# Altium footprint library 总库.PcbLib: 264 footprints (part 11 of 17)
Each footprint in its own frame and in the unit in brackets; x right, y up, seen from the top. Pads: shape width x height; smd on the part's side, far side on the other; paste and mask are expansions set on the pad; w line width, h text height; cw(c..) or ccw(c..) is an arc to the next point about the centre after c.
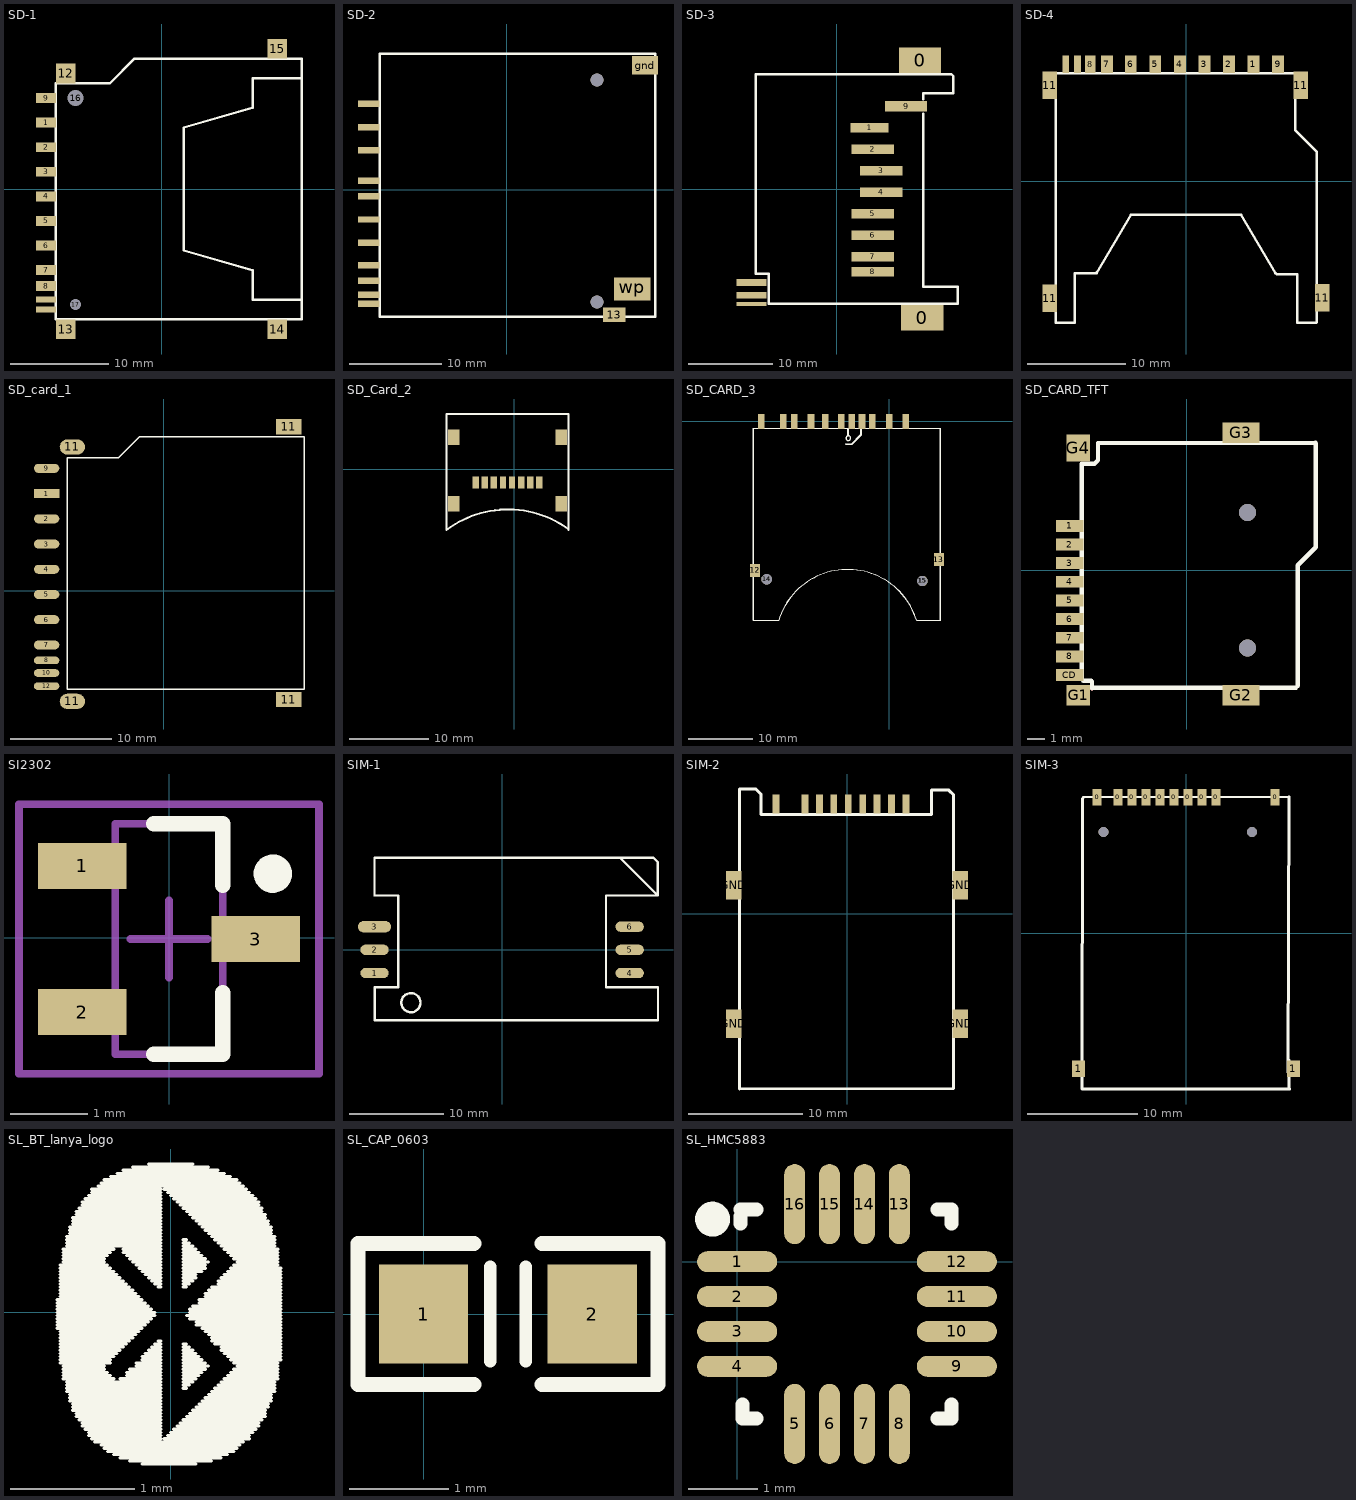
[diagram p10: the footprints below, top view; thin cyan lines are the x and y axes]

## SD-1 [mm]
pads (17):
  rect 2x1 smd: 1(-11.75,6.75) 2(-11.75,4.25) 3(-11.75,1.75) 4(-11.75,-0.75) 5(-11.75,-3.25) 6(-11.75,-5.75) 7(-11.75,-8.25) 8(-11.75,-9.875) 9(-11.75,9.25)
  rect 2x0.6 smd: 10(-11.75,-12.25) 11(-11.75,-11.25)
  rect 2x2 smd: 12(-9.75,11.75) 13(-9.75,-14.25) 14(11.75,-14.25) 15(11.75,14.25)
  round 1.5 hole 1.6: 16(-8.75,9.25)
  round 1 hole 1.1: 17(-8.75,-11.75)
Top Overlay:
  lines w0.254: 14.25,-11.25 9.25,-11.25 9.25,-8.25 2.25,-6.25 2.25,6.25 9.25,8.25 9.25,11.25 14.25,11.25 ; -10.75,-13.25 -10.75,10.75 -5.25,10.75 -2.75,13.25 14.25,13.25 14.25,-13.25 -10.75,-13.25

## SD-2 [mm]
pads (14):
  rect 2.35x0.7 smd: 1(-14.935,6.8) 2(-14.935,4.3) 3(-14.935,1) 4(-14.935,-0.7) 5(-14.935,-3.2) 6(-14.935,-5.7) 7(-14.935,-8.13) 8(-14.935,-9.82) 9(-14.935,9.3) cd(-14.935,-11.32) com(-14.935,-12.32)
  rect 2.4x1.6 smd: 13(11.595,-13.5)
  rect 2.8x2 smd: gnd(14.935,13.5)
  rect 3.95x2.5 smd: wp(13.565,-10.7)
via 9.735,11.9 diameter 1.4 hole 1.4
via 9.735,-12.1 diameter 1.4 hole 1.4
Top Overlay:
  lines w0.254: -13.76,-13.72 16.045,-13.72 16.045,14.72 -13.76,14.72 -13.76,-13.72

## SD-3 [mm]
pads (14):
  rect 5x3 smd: 0(9.843,15.24) 0(10.097,-15.24)
  rect 4.5x1.143 smd: 1(3.874,7.239)
  rect 5x1.143 smd: 2(4.255,4.699) 3(5.271,2.159) 4(5.271,-0.381) 5(4.255,-2.921) 6(4.255,-5.461) 7(4.255,-8.001) 8(4.255,-9.779)
  rect 5x1.27 smd: 9(8.192,9.779)
  rect 3.556x0.8 smd: 10(-10.097,-11.049) 11(-10.097,-12.573)
  rect 3.556x0.5 smd: 12(-10.097,-13.589)
Top Overlay:
  lines w0.3: 7.683,-13.589 14.287,-13.589 14.287,-11.557 10.223,-11.557 10.223,8.889 ; 8.191,-13.589 -8.065,-13.589 -8.065,-10.033 -9.589,-10.033 -9.589,13.589 8.191,13.589 13.525,13.589 13.779,13.335 13.779,11.303 10.223,11.303 10.223,10.59

## SD-4 [mm]
pads (15):
  rect 1.2x1.8 smd: 1(6.858,11.917) 2(4.369,11.917) 3(1.875,11.908) 4(-0.625,11.908) 5(-3.125,11.908) 6(-5.625,11.908) 7(-8.05,11.908) 9(9.375,11.908)
  rect 1.1x1.8 smd: 8(-9.754,11.917)
  rect 0.7x1.8 smd: 10(-11.05,11.908) 12(-12.243,11.917)
  rect 1.5x2.8 smd: 11(-13.868,-11.917) 11(-13.868,9.774) 11(11.684,9.774) 11(13.868,-11.866)
Top Overlay:
  lines w0.254: -11.3,-9.383 -11.3,-14.383 -13.273,-14.383 -13.273,11.003 -13.259,11.017 11.1,11.017 11.1,5.207 13.289,3.018 13.3,3.018 13.3,-14.356 13.273,-14.383 11.3,-14.383 11.3,-9.484 9.258,-9.484 9.1,-9.326 ; -11.249,-9.377 -9.207,-9.377 -9.049,-9.219 ; -9.1,-9.377 -5.588,-3.383 ; -5.6,-3.383 5.6,-3.383 9.1,-9.377
Multi-Layer:
  circle w0.254: c9.5,8.657 r0.82
  circle w0.254: c-11.532,8.617 r0.58

## SD_card_1 [mm]
pads (15):
  rect 2.5x0.889 smd: 1(-11.54,9.59)
  oval 2.5x0.889 smd: 2(-11.54,7.101) 3(-11.54,4.612) 4(-11.54,2.122) 5(-11.54,-0.367) 6(-11.54,-2.856) 7(-11.54,-5.345) 9(-11.54,12.079)
  oval 2.5x0.762 smd: 8(-11.54,-6.869) 10(-11.54,-8.114) 12(-11.54,-9.409)
  oval 2.5x1.5 smd: 11(-9,-10.91) 11(-9,14.19)
  rect 2.5x1.5 smd: 11(12.336,-10.73) 11(12.336,16.194)
Top Overlay:
  lines w0.152: -5.952,13.146 -9.508,13.146 ; 8.272,15.178 13.86,15.178 13.86,-9.714 10.812,-9.714 ; 11.32,-9.714 -9.508,-9.714 -9.508,13.146 ; 11.32,15.178 -2.396,15.178 -4.428,13.146 -9.508,13.146

## SD_Card_2 [mm]
height 12.75
pads (12):
  rect 0.8x1.5 smd: 1(3.175,-1.651) 2(2.032,-1.651) 3(0.889,-1.651) 4(-0.254,-1.651) 5(-1.397,-1.651) 6(-2.54,-1.651) 7(-3.683,-1.651) 8(-4.826,-1.651)
  rect 1.45x2 smd: ""(-7.62,-4.318) ""(-7.62,4.064) ""(5.969,-4.318) ""(5.969,4.064)
Top Overlay:
  lines w0.254: 6.782,-7.471 ccw(c-0.762,-17.907) -8.509,-7.62 -8.509,6.985 6.858,6.985 6.858,-7.62

## SD_CARD_3 [mm]
pads (30):
  rect 1x2.3 smd: 1(0,0) 1(0.025,0) 2(-2.6,0) 2(-2.575,0) 3(-4.2,0) 3(-4.175,0) 4(-7.4,0) 4(-7.375,0) 5(-9.9,0) 5(-9.875,0) 6(-12.1,0) 6(-12.075,0) 7(-14.7,0) 7(-14.675,0) 8(-16.4,0) 8(-16.375,0) 9(2.55,0) 9(2.575,0) 10(-5.8,0) 10(-5.775,0) 11(-19.8,0) 11(-19.775,0)
  rect 1.524x2 smd: 12(-20.754,-23.05) 12(-20.729,-23.05) 13(7.694,-21.394) 13(7.719,-21.394)
  round 1.6 hole 1.6: 14(-18.976,-24.442) 14(-18.951,-24.442) 15(5.154,-24.696) 15(5.179,-24.696)
Top Overlay:
  circle w0.102: c-6.33,-2.59 r0.365
  circle w0.102: c-6.305,-2.59 r0.365
  lines w0.102: -6.71,-3.45 -6.71,-3.57 -5.74,-3.57 -4.23,-2.06 -4.23,-1.12 -4.4,-1.12 -4.4,-2.01 -5.81,-3.42 -6.67,-3.42 ; -6.685,-3.45 -6.685,-3.57 -5.715,-3.57 -4.205,-2.06 -4.205,-1.12 -4.375,-1.12 -4.375,-2.01 -5.785,-3.42 -6.645,-3.42 ; -6.38,-2.22 -6.28,-2.22 -6.28,-1.14 -6.38,-1.14 -6.38,-2.22 ; -6.355,-2.22 -6.255,-2.22 -6.255,-1.14 -6.355,-1.14 -6.355,-2.22
  lines w0.127: -17.103,-30.756 cw(c-6.431,-34.1) 4.24,-30.756 ; -17.099,-30.792 -21.008,-30.792 -21.008,-1.074 7.948,-1.074 7.948,-30.792 4.241,-30.792 4.241,-30.76 ; -17.077,-30.756 cw(c-6.406,-34.1) 4.266,-30.756 ; -17.073,-30.792 -20.983,-30.792 -20.983,-1.074 7.973,-1.074 7.973,-30.792 4.267,-30.792 4.267,-30.76

## SD_CARD_TFT [mm]
pads (13):
  rect 1.6x0.7 smd: 1(-6.904,2.631) 2(-6.904,1.531) 3(-6.904,0.431) 4(-6.904,-0.669) 5(-6.904,-1.769) 6(-6.904,-2.869) 7(-6.904,-3.969) 8(-6.904,-5.069) CD(-6.904,-6.169)
  rect 1.4x1.2 smd: G1(-6.404,-7.369)
  rect 2.2x1.2 smd: G2(3.196,-7.369) G3(3.196,8.131)
  rect 1.4x1.6 smd: G4(-6.404,7.231)
via 3.596,3.431 diameter 1 hole 1
via 3.596,-4.569 diameter 1 hole 1
Top Layer:
  lines w0.254: -5.593,-6.963 -5.542,-6.912
Top Overlay:
  lines w0.254: -5.593,-6.963 -5.593,-6.556 -5.643,-6.505 -6.101,-6.505 -6.202,-6.404 -6.202,6.296 -5.44,6.296 -5.237,6.499 -5.237,7.515 7.596,7.531 ; -5.542,-6.912 6.447,-6.912 6.549,-6.81 6.549,0.302 7.615,1.369 7.615,7.511
3D body: height 1.85, standoff -0.6, extent -7.62,-7.619 7.63,8.381

## SI2302 [mm] "MOSFET-N"
pads (3):
  rect 1.15x0.6 smd: 1(-1.128,0.934) 2(-1.128,-0.966) 3(1.122,-0.016)
Top Overlay:
  circle w0.25: c1.347,0.834 r0.125
  lines w0.2: -0.203,-1.516 0.697,-1.516 0.697,-0.716 ; -0.203,1.484 0.697,1.484 0.697,0.684
Mechanical 13:
  lines w0.1: -0.703,-1.516 0.697,-1.516 0.697,1.484 -0.703,1.484 -0.703,-1.516
Mechanical 15:
  lines w0.1: -0.503,-0.016 0.497,-0.016 ; -0.003,-0.516 -0.003,0.484 ; -1.953,-1.766 1.947,-1.766 1.947,1.734 -1.953,1.734 -1.953,-1.766
3D body: height 1.1, standoff 0, extent -0.703,-1.516 0.697,1.484

## SIM-1 [mm]
pads (6):
  oval 3x1.1 smd: 1(-13.5,-2.45) 2(-13.5,0) 4(13.5,-2.45) 5(13.5,0) 6(13.5,2.45)
  oval 3.5x1.2 smd: 3(-13.5,2.45)
Top Overlay:
  circle w0.254: c-9.652,-5.588 r1.016
  lines w0.254: -13.495,-7.43 -13.495,-3.95 -11,-3.95 -11,5.735 ; -13.475,-7.45 16.5,-7.45 ; -11,5.75 -13.492,5.75 -13.5,5.758 -13.5,9.75 16.011,9.75 16.467,9.294 16.467,5.75 ; 11,-3.95 11,5.75 16.467,5.75 ; 11.005,-3.95 14.923,-3.95 ; 12.467,9.75 16.467,5.75 ; 14.542,-3.95 16.495,-3.95 16.495,-7.445

## SIM-2 [mm]
pads (13):
  rect 0.6x1.65 smd: 0(-6.25,9.662) 0(-3.7,9.662) 0(-2.43,9.662) 0(-1.16,9.662) 0(0.11,9.662) 0(1.38,9.662) 0(2.65,9.662) 0(3.92,9.662) 0(5.19,9.662)
  rect 1.35x2.5 smd: GND(-9.95,-9.662) GND(-9.95,2.538) GND(9.95,-9.662) GND(9.95,2.537)
Top Overlay:
  lines w0.254: -9.44,-15.382 9.356,-15.331 9.356,10.475 8.949,10.882 7.425,10.882 7.425,8.748 -7.561,8.748 -7.561,10.526 -8.018,10.983 -9.186,10.983 -9.44,10.983 -9.44,-15.382

## SIM-3 [mm]
pads (12):
  rect 0.8x1.5 smd: 0(-8.07,12.325) 0(-6.17,12.325) 0(-4.9,12.325) 0(-3.63,12.325) 0(-2.36,12.325) 0(-1.09,12.325) 0(0.18,12.325) 0(1.45,12.325) 0(2.72,12.325) 0(8.08,12.325)
  rect 1.2x1.5 smd: 1(-9.75,-12.325) 1(9.75,-12.325)
via -7.5,9.175 diameter 0.9 hole 0.9
via 6,9.175 diameter 0.9 hole 0.9
Top Overlay:
  lines w0.254: 7.778,12.325 9.353,12.375 ; 9.251,-12.618 9.353,12.375 ; 9.353,-11.501 9.353,-14.091 9.404,-14.142 8.642,-14.142 -9.443,-14.142 -9.392,12.223 -9.291,12.325 9.353,12.375

## SL_BT_lanya_logo [mm]
Top Overlay:
  drawing of 233 lines, arcs and shapes, not listed

## SL_CAP_0603 [mm] "Chip Capacitor, Body 1.6x0.8mm, 0603, IPC Medium Density"
height 0.8
pads (2):
  rect 0.9x1 smd: 1(0,0) 2(1.7,0)
Top Overlay:
  lines w0.127: 0.672,-0.476 0.672,0.476 ; 1.028,-0.476 1.028,0.476
  lines w0.152: 0.508,-0.711 -0.66,-0.711 -0.66,0.711 0.508,0.711 ; 1.194,-0.711 2.362,-0.711 2.362,0.711 1.194,0.711
3D body: height 0.78, standoff -0.02, extent 0.038,-0.468 1.638,0.432

## SL_HMC5883 [mm] "LCC, 16-Pins, Body 3.0x3.0mm (max), Pitch 0.50mm, IPC Medium Density"
height 2.54
pads (16):
  oval 1.15x0.3 smd: 1(0,0) 2(0,-0.5) 3(0,-1) 4(0,-1.5) 9(3.15,-1.5) 10(3.15,-1) 11(3.15,-0.5) 12(3.15,0)
  oval 0.3x1.15 smd: 5(0.825,-2.325) 6(1.325,-2.325) 7(1.825,-2.325) 8(2.325,-2.325) 13(2.325,0.825) 14(1.825,0.825) 15(1.325,0.825) 16(0.825,0.825)
Top Overlay:
  circle w0.25: c-0.354,0.61 r0.125
  lines w0.2: 0.051,0.547 0.051,0.647 ; 0.051,0.75 0.275,0.75 ; 0.075,-2.05 0.075,-2.25 0.275,-2.25 ; 2.875,-2.25 3.075,-2.25 3.075,-2.05 ; 2.875,0.75 3.075,0.75 3.075,0.55
3D body: height 0.79, standoff 0, extent 0.226,-0.272 1.074,0.577
3D body: height 0.76, standoff 0, extent 0,-2.35 3.15,0.864

## SL_logo_xiao [mm]